# Altium footprint library MC1.PcbLib: 70 footprints (part 5 of 5)
Each footprint in its own frame and in the unit in brackets; x right, y up, seen from the top. Pads: shape width x height; smd on the part's side, far side on the other; paste and mask are expansions set on the pad; w line width, h text height; cw(c..) or ccw(c..) is an arc to the next point about the centre after c.
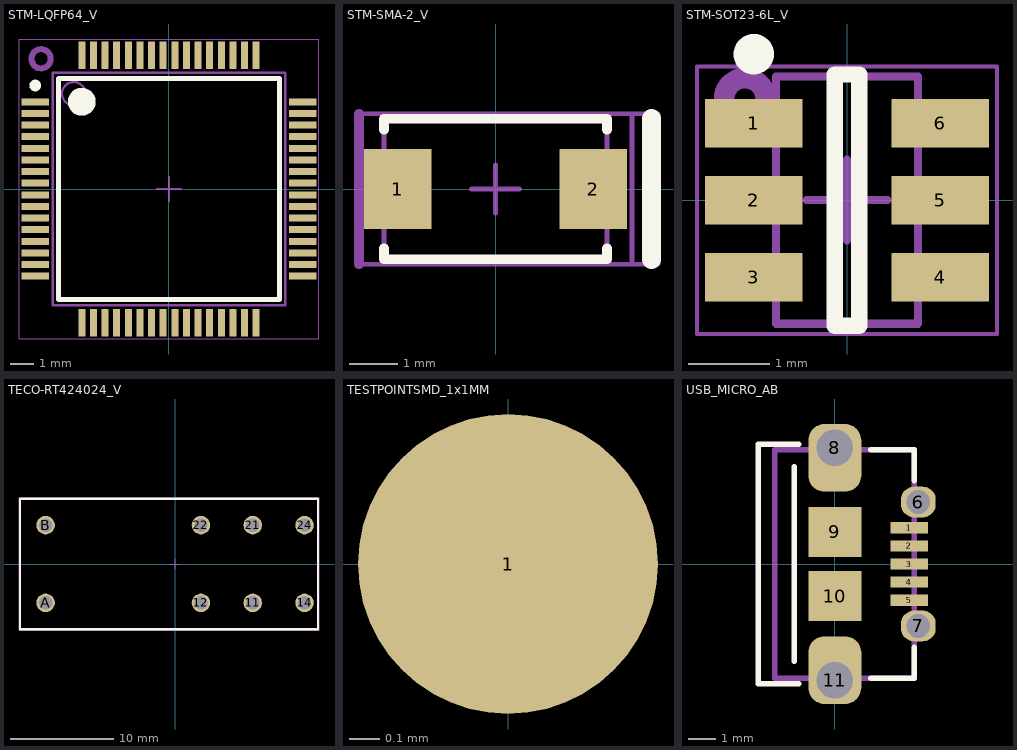
[diagram p4: the footprints below, top view; thin cyan lines are the x and y axes]

## STM-LQFP64_V [mm] "Thin QFP, 64-Leads, Body 10x10mm, Pitch 0.5mm, ST Recommended"
height 1.6
pads (64):
  rect 1.2x0.3 smd: 1(-5.75,3.75) 2(-5.75,3.25) 3(-5.75,2.75) 4(-5.75,2.25) 5(-5.75,1.75) 6(-5.75,1.25) 7(-5.75,0.75) 8(-5.75,0.25) 9(-5.75,-0.25) 10(-5.75,-0.75) 11(-5.75,-1.25) 12(-5.75,-1.75) 13(-5.75,-2.25) 14(-5.75,-2.75) 15(-5.75,-3.25) 16(-5.75,-3.75) 33(5.75,-3.75) 34(5.75,-3.25) 35(5.75,-2.75) 36(5.75,-2.25) 37(5.75,-1.75) 38(5.75,-1.25) 39(5.75,-0.75) 40(5.75,-0.25) 41(5.75,0.25) 42(5.75,0.75) 43(5.75,1.25) 44(5.75,1.75) 45(5.75,2.25) 46(5.75,2.75) 47(5.75,3.25) 48(5.75,3.75)
  rect 0.3x1.2 smd: 17(-3.75,-5.75) 18(-3.25,-5.75) 19(-2.75,-5.75) 20(-2.25,-5.75) 21(-1.75,-5.75) 22(-1.25,-5.75) 23(-0.75,-5.75) 24(-0.25,-5.75) 25(0.25,-5.75) 26(0.75,-5.75) 27(1.25,-5.75) 28(1.75,-5.75) 29(2.25,-5.75) 30(2.75,-5.75) 31(3.25,-5.75) 32(3.75,-5.75) 49(3.75,5.75) 50(3.25,5.75) 51(2.75,5.75) 52(2.25,5.75) 53(1.75,5.75) 54(1.25,5.75) 55(0.75,5.75) 56(0.25,5.75) 57(-0.25,5.75) 58(-0.75,5.75) 59(-1.25,5.75) 60(-1.75,5.75) 61(-2.25,5.75) 62(-2.75,5.75) 63(-3.25,5.75) 64(-3.75,5.75)
Top Overlay:
  circle w0.6: c-3.75,3.75 r0.3
  circle w0.25: c-5.75,4.45 r0.125
  lines w0.2: -4.75,-4.75 4.75,-4.75 4.75,4.75 -4.75,4.75 -4.75,-4.75
Top Courtyard:
  lines w0.05: -6.45,-6.45 6.45,-6.45 6.45,6.45 -6.45,6.45 -6.45,-6.45
  lines w0.1: -0.5,0 0.5,0 ; 0,-0.5 0,0.5
Mechanical 13:
  circle w0.1: c-4.1,4.1 r0.5
  lines w0.1: -5,-5 5,-5 5,5 -5,5 -5,-5
Mechanical 15:
  lines w0.05: -6.45,-6.45 6.45,-6.45 6.45,6.45 -6.45,6.45 -6.45,-6.45
  lines w0.1: -0.5,0 0.5,0 ; 0,-0.5 0,0.5
Top Assembly (Mech29):
  circle w0.254: c-5.5,5.6 r0.412
  lines w0.05: -6.45,-6.45 6.45,-6.45 6.45,6.45 -6.45,6.45 -6.45,-6.45
  text "'.Designator'" at -2.878,-0.212 h0.51
3D body: height 1.6, standoff 0.05, extent -5,-5 5,5

## STM-SMA-2_V [mm] "Diode, 2-Leads, Body 4.6x2.9mm"
height 2.585
pads (2):
  rect 1.4x1.64 smd: 1(-2.015,0) 2(2.015,0)
Top Overlay:
  lines w0.2: -2.3,-1.22 -2.3,-1.45 2.3,-1.45 2.3,-1.22 ; -2.3,1.22 -2.3,1.45 2.3,1.45 2.3,1.22
  lines w0.4: 3.215,-1.45 3.215,1.45
Top Courtyard:
  lines w0.05: -2.815,-1.55 -2.815,1.55 2.815,1.55 2.815,-1.55 -2.815,-1.55
  lines w0.1: -0.5,0 0.5,0 ; 0,-0.5 0,0.5
Mechanical 13:
  lines w0.1: -2.3,-1.45 -2.3,1.45 2.3,1.45 2.3,-1.45 -2.3,-1.45
Mechanical 15:
  lines w0.05: -2.815,-1.55 -2.815,1.55 2.815,1.55 2.815,-1.55 -2.815,-1.55
  lines w0.1: -0.5,0 0.5,0 ; 0,-0.5 0,0.5
Top Assembly (Mech29):
  lines w0.1: -2.815,-1.55 2.815,-1.55 ; -2.815,1.55 2.815,1.55 ; 2.815,-1.55 3.35,-1.55 3.35,1.55 2.815,1.55 ; 2.815,-1.55 2.815,1.55
  lines w0.2: -2.815,-1.55 -2.815,1.55
  text "'.Designator'" at -2.878,-0.212 h0.51
3D body: height 2.59, standoff 2.59, extent 0.8,-1.45 1,1.45
3D body: height 2.59, standoff 0.05, extent -2.3,-1.45 2.3,1.45

## STM-SOT23-6L_V [mm] "SOT23, 6-Leads, Body 3.05x1.75mm, Pitch 0.95mm"
height 1.45
pads (6):
  rect 1.2x0.6 smd: 1(-1.15,0.95) 2(-1.15,0) 3(-1.15,-0.95) 4(1.15,-0.95) 5(1.15,0) 6(1.15,0.95)
Top Overlay:
  circle w0.25: c-1.15,1.8 r0.125
  lines w0.2: -0.15,-1.55 0.15,-1.55 0.15,1.55 -0.15,1.55 -0.15,-1.55
Top Courtyard:
  lines w0.05: -1.85,-1.65 -1.85,1.65 1.85,1.65 1.85,-1.65 -1.85,-1.65
  lines w0.1: -0.5,0 0.5,0 ; 0,-0.5 0,0.5
Mechanical 13:
  lines w0.1: -0.875,-1.525 -0.875,1.525 0.875,1.525 0.875,-1.525 -0.875,-1.525
Mechanical 15:
  lines w0.05: -1.85,-1.65 -1.85,1.65 1.85,1.65 1.85,-1.65 -1.85,-1.65
  lines w0.1: -0.5,0 0.5,0 ; 0,-0.5 0,0.5
Top Assembly (Mech29):
  circle w0.254: c-1.258,1.25 r0.257
  lines w0.05: -1.85,-1.65 -1.85,1.65 1.85,1.65 1.85,-1.65 -1.85,-1.65
  text "'.Designator'" at -2.878,-0.212 h0.51
3D body "SOT95P280X145-6L.step": height 1.45, standoff 0, extent -1.6,-1.525 1.6,1.525

## TECO-RT424024_V [mm] "Relay, 8-Leads, Body 29x12.7mm, Height 15.7mm"
height 15.7
pads (8):
  round 1.8 hole 1.3: 11(7.56,-3.78) 12(2.52,-3.78) 14(12.6,-3.78) 21(7.56,3.78) 22(2.52,3.78) 24(12.6,3.78) A(-12.6,-3.78) B(-12.6,3.78)
Top Overlay:
  lines w0.2: -15.09,-6.35 13.91,-6.35 13.91,6.35 -15.09,6.35 -15.09,-6.35
Top Courtyard:
  lines w0.2: -15.09,-6.35 13.91,-6.35 13.91,6.35 -15.09,6.35 -15.09,-6.35
Mechanical 13:
  lines w0.1: -15.09,-6.35 -15.09,6.35 13.91,6.35 13.91,-6.35 -15.09,-6.35
Mechanical 15:
  lines w0.05: -15.19,-6.45 14.01,-6.45 14.01,6.45 -15.19,6.45 -15.19,-6.45
  lines w0.1: -0.5,0 0.5,0 ; 0,-0.5 0,0.5
Top Assembly (Mech29):
  lines w0.2: -13.2,-3.8 -12,-3.8 ; -12.6,-4.4 -12.6,-3.2 ; -15.09,-6.35 13.91,-6.35 13.91,6.35 -15.09,6.35 -15.09,-6.35
  text "'.Designator'" at -13.865,-0.417 h1
3D body "c-6-1393243-8-b-3d.stp": height 15.7, standoff -3.6, extent -15.09,-6.35 13.91,6.35

## TESTPOINTSMD_1x1MM [mm] "Test point pad SMD round 1mm diameter"
pads (1):
  round 1 smd paste+0 mask+0.102: 1(0,0)

## USB_MICRO_AB [mm]
pads (11):
  rect 1.35x0.4 smd mask+0.025: 1(2.675,1.3) 2(2.675,0.65) 3(2.675,0) 4(2.675,-0.65) 5(2.675,-1.3)
  rrect84% 1.25x1.1 hole 0.85 mask+0.04: 6(3,2.225) 7(3,-2.225)
  rrect60% 1.9x2.425 hole 1.3 copper offset 0,-0.363: 8(0,4.175)
  rect 1.9x1.8 smd paste-10: 9(0,1.15) 10(0,-1.15)
  rrect60% 1.9x2.425 hole 1.3 copper offset 0,0.363: 11(0,-4.175)
Top Overlay:
  lines w0.2: -1.45,-3.5 -1.45,3.5 ; -1.3,-4.3 -2.75,-4.3 -2.75,4.3 -1.3,4.3 ; 1.3,-4.1 2.85,-4.1 2.85,-3 ; 1.3,4.1 2.85,4.1 2.85,3
Top Assembly (Mech29):
  lines w0.2: -2.15,-4.1 -2.15,4.1 2.85,4.1 2.85,-4.1 -2.15,-4.1
  text ".Designator" at 1.2,-1.9 h1.52
3D body "475890001.stp": height 2.76, standoff -0.58, extent -2.75,-4.325 3.045,4.325